# Altium footprint library SILICA_PCBLIB.PcbLib: 161 footprints (part 3 of 11)
Each footprint in its own frame and in the unit in brackets; x right, y up, seen from the top. Pads: shape width x height; smd on the part's side, far side on the other; paste and mask are expansions set on the pad; w line width, h text height; cw(c..) or ccw(c..) is an arc to the next point about the centre after c.
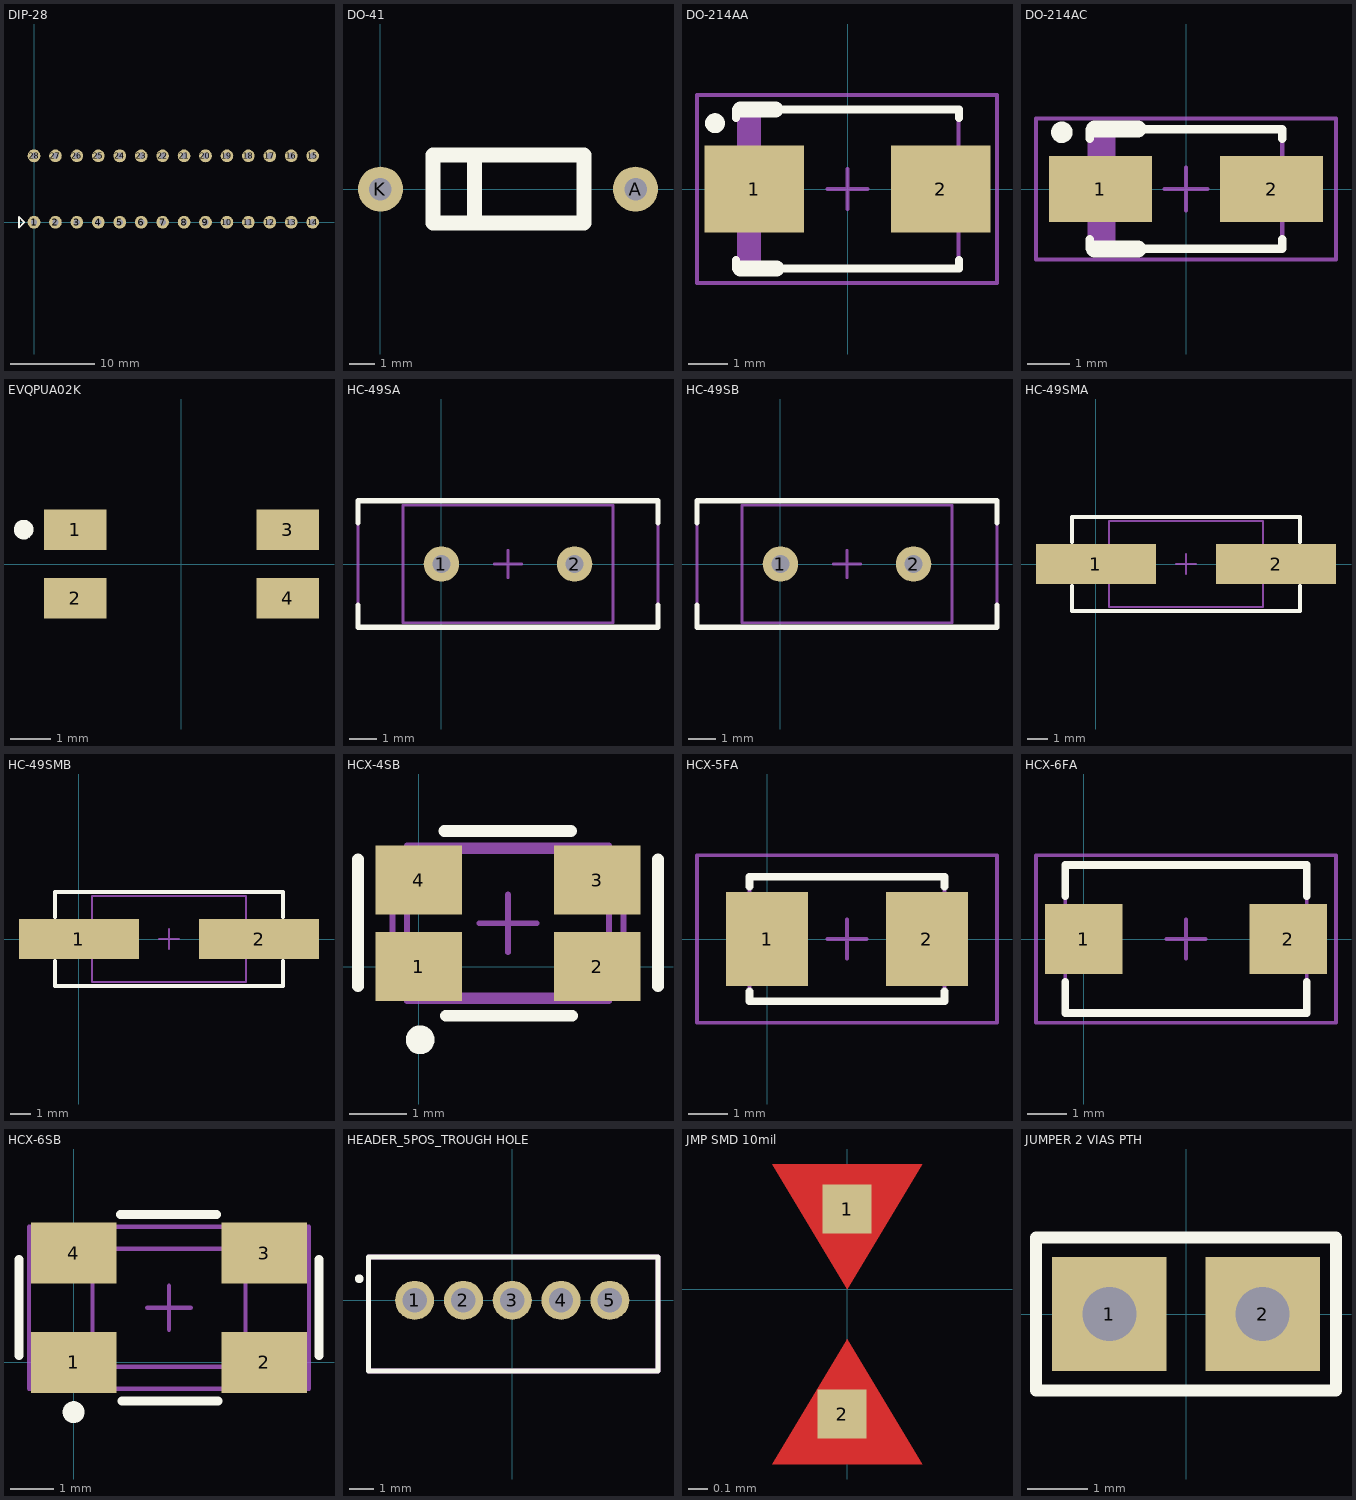
[diagram p2: the footprints below, top view; thin cyan lines are the x and y axes]

## DIP-28 [mm]
pads (28):
  round 1.5 hole 0.75: 1(0,0) 2(2.54,0) 3(5.08,0) 4(7.62,0) 5(10.16,0) 6(12.7,0) 7(15.24,0) 8(17.78,0) 9(20.32,0) 10(22.86,0) 11(25.4,0) 12(27.94,0) 13(30.48,0) 14(33.02,0) 15(33.02,7.87) 16(30.48,7.87) 17(27.94,7.87) 18(25.4,7.87) 19(22.86,7.87) 21(17.78,7.87) 22(15.24,7.87) 23(12.7,7.87) 25(7.62,7.87) 26(5.08,7.87) 27(2.54,7.87)
  round 1.524 hole 0.762: 20(20.32,7.87) 24(10.16,7.87) 28(0,7.87)
Top Overlay:
  lines w0.2: -1.778,-0.635 -1.778,0.635 -1.143,0 -1.778,-0.635
3D body "SW3dPS-28 pin dip.STEP": height 4.65, standoff -1.57, extent -1.651,0 34.29,7.874

## DO-41 [mm] "DO-41"
pads (2):
  round 1.8 hole 0.9: A(10.2,0) K(0,0)
Top Overlay:
  lines w0.6: 3.755,-1.311 3.755,1.363 ; 2.097,-1.358 2.097,-0.761 2.097,1.36 8.147,1.36 8.147,-1.358 2.097,-1.358
3D body "User Library-DO-41-3.STEP": height 3.35, standoff -2, extent -0.382,-1.341 10.638,1.359

## DO-214AA [mm]
height 2.3
pads (2):
  rect 2.5x2.2 smd paste-0.051 mask+0: 1(-2.35,0) 2(2.35,0)
Top Overlay:
  circle w0.25: c-3.332,1.655 r0.125
  lines w0.2: -2.8,-2.005 -2.8,-1.78 ; -2.8,1.78 -2.8,2.005 ; -2.692,-2 2.8,-2 ; -2.667,2 2.8,2 ; 2.8,-2.005 2.8,-1.78 ; 2.8,1.78 2.8,2.005
  lines w0.4: -2.692,-2 -1.784,-2 ; -2.692,2 -1.809,2
Mechanical 13:
  rectangle: -2.783,-2 -2.178,2
  lines w0.1: -2.25,-1.975 -2.25,1.981 2.794,1.981 2.794,-1.975 -2.25,-1.975
Mechanical 15:
  lines w0.1: -0.5,0 0.5,0 ; 0,-0.5 0,0.5 ; -3.785,-2.362 -3.785,2.362 3.759,2.362 3.759,-2.362 -3.785,-2.362
3D body "User Library-DO-214AA(SMB).STEP": height 2.6, standoff -0.05, extent -2.794,-1.975 2.794,1.975

## DO-214AC [mm]
height 2.3
pads (2):
  rect 2.4x1.55 smd paste-0.051 mask+0: 1(-2,0) 2(2,0)
Top Overlay:
  circle w0.25: c-2.9,1.325 r0.125
  lines w0.2: -2.25,-1.175 -2.25,-1.4 2.25,-1.4 2.25,-1.175 ; -2.25,1.175 -2.25,1.4 2.25,1.4 2.25,1.175
  lines w0.4: -2.134,-1.4 -1.118,-1.4 ; -2.134,1.4 -1.118,1.4
Mechanical 13:
  rectangle: -2.25,-1.395 -1.645,1.395
  lines w0.1: -2.25,-1.395 2.25,-1.395 2.25,1.395 -2.25,1.395 -2.25,-1.395
Mechanical 15:
  lines w0.1: -0.5,0 0.5,0 ; 0,-0.5 0,0.5 ; -3.505,-1.65 3.505,-1.65 3.505,1.65 -3.505,1.65 -3.505,-1.65
3D body "SW3dPS-DO-214AC SMA.STEP": height 1, standoff -1.4, extent -2.6,-1.3 2.6,1.3

## EVQPUA02K [mm]
pads (4):
  rect 1.55x1 smd: 1(-2.625,0.85) 2(-2.625,-0.85) 3(2.625,0.85) 4(2.625,-0.85)
Top Overlay:
  circle w0.254: c-3.9,0.85 r0.115
3D body "EVQPU-JA-02K.STEP": height 1.65, standoff 0, extent -3.188,-1.79 3.212,2.75

## HC-49SA [mm] "LOW PROFILE HOLDER TYPE CRYSTAL UNITS"
height 3.5
pads (2):
  round 1.3 hole 0.65: 1(0,0) 2(4.88,0)
Top Overlay:
  lines w0.2: -3.06,-1.52 -3.06,-2.32 7.94,-2.32 7.94,-1.52 ; -3.06,1.52 -3.06,2.32 7.94,2.32 7.94,1.52
Mechanical 13:
  lines w0.1: -3.06,-2.32 7.94,-2.32 7.94,2.32 -3.06,2.32 -3.06,-2.32
Mechanical 15:
  lines w0.1: 1.94,0 2.94,0 ; 2.44,-0.5 2.44,0.5 ; -1.41,-2.15 -1.41,2.15 6.29,2.15 6.29,-2.15 -1.41,-2.15
3D body "SW3dPS-HC49S.STEP": height 3.63, standoff -1.97, extent -3.149,-2.299 8.023,2.373

## HC-49SB [mm] "LOW PROFILE HOLDER TYPE CRYSTAL UNITS"
height 2.5
pads (2):
  round 1.3 hole 0.65: 1(0,0) 2(4.88,0)
Top Overlay:
  lines w0.2: -3.06,-1.52 -3.06,-2.32 7.94,-2.32 7.94,-1.52 ; -3.06,1.52 -3.06,2.32 7.94,2.32 7.94,1.52
Mechanical 13:
  lines w0.1: -3.06,-2.32 -3.06,2.32 7.94,2.32 7.94,-2.32 -3.06,-2.32
Mechanical 15:
  lines w0.1: 1.94,0 2.94,0 ; 2.44,-0.5 2.44,0.5 ; -1.41,-2.15 6.29,-2.15 6.29,2.15 -1.41,2.15 -1.41,-2.15
3D body "SW3dPS-HC49S.STEP": height 3.63, standoff -1.97, extent -3.138,-2.325 8.034,2.348

## HC-49SMA [mm] "SURFACE MOUNT CRYSTAL"
height 4.2
pads (2):
  rect 6x2 smd paste-0.051 mask+0: 1(0,0) 2(9,0)
Top Overlay:
  lines w0.2: -1.2,-1.1 -1.2,-2.35 10.2,-2.35 10.2,-1.1 ; -1.2,1.1 -1.2,2.35 10.2,2.35 10.2,1.1
Mechanical 13:
  lines w0.1: -1.2,-2.35 -1.2,2.35 10.2,2.35 10.2,-2.35 -1.2,-2.35
Mechanical 15:
  lines w0.1: 4,0 5,0 ; 4.5,-0.5 4.5,0.5 ; 0.65,-2.15 8.35,-2.15 8.35,2.15 0.65,2.15 0.65,-2.15
3D body: height 4.2, standoff 0, extent -1.2,-2.35 10.2,2.35

## HC-49SMB [mm] "SURFACE MOUNT CRYSTAL"
height 3.2
pads (2):
  rect 6x2 smd paste-0.051 mask+0: 1(0,0) 2(9,0)
Top Overlay:
  lines w0.2: -1.2,-1.1 -1.2,-2.35 10.2,-2.35 10.2,-1.1 ; -1.2,1.1 -1.2,2.35 10.2,2.35 10.2,1.1
Mechanical 13:
  lines w0.1: -1.2,-2.35 10.2,-2.35 10.2,2.35 -1.2,2.35 -1.2,-2.35
Mechanical 15:
  lines w0.1: 4,0 5,0 ; 4.5,-0.5 4.5,0.5 ; 0.65,-2.15 0.65,2.15 8.35,2.15 8.35,-2.15 0.65,-2.15
3D body: height 3.2, standoff 0, extent -1.2,-2.35 10.2,2.35

## HCX-4SB [mm] "Cristal de Quartzo em SMD"
height 1
pads (4):
  rect 1.5x1.2 smd paste-0.051 mask+0: 1(0,0) 2(3.1,0) 3(3.1,1.5) 4(0,1.5)
Top Overlay:
  circle w0.25: c0.028,-1.269 r0.125
  lines w0.2: -1.05,-0.342 -1.05,1.858 ; 0.442,2.35 2.642,2.35 ; 0.468,-0.85 2.668,-0.85 ; 4.15,-0.342 4.15,1.858
Mechanical 13:
  lines w0.1: -0.45,-0.5 -0.45,2 3.55,2 3.55,-0.5 -0.45,-0.5
Mechanical 15:
  lines w0.1: 1.05,0.75 2.05,0.75 ; 1.55,0.25 1.55,1.25 ; -0.2,-0.6 -0.2,2.1 3.3,2.1 3.3,-0.6 -0.2,-0.6
3D body: height 1.2, standoff 0, extent -0.45,-0.5 3.55,2

## HCX-5FA [mm] "SURFACE MOUNT CRYSTAL"
height 1.2
pads (2):
  rect 2.1x2.4 smd paste-0.051 mask+0: 1(0,0) 2(4.1,0)
Top Overlay:
  lines w0.2: -0.45,-1.35 -0.45,-1.6 4.55,-1.6 4.55,-1.35 ; -0.45,1.35 -0.45,1.6 4.55,1.6 4.55,1.35
Mechanical 13:
  lines w0.1: -0.45,-1.6 -0.45,1.6 4.55,1.6 4.55,-1.6 -0.45,-1.6
Mechanical 15:
  lines w0.1: 1.55,0 2.55,0 ; 2.05,-0.5 2.05,0.5 ; -1.8,-2.15 5.9,-2.15 5.9,2.15 -1.8,2.15 -1.8,-2.15
3D body: height 1.2, standoff 0, extent -0.45,-1.6 4.55,1.6

## HCX-6FA [mm] "SURFACE MOUNT CRYSTAL"
height 1.2
pads (2):
  rect 2x1.8 smd paste-0.051 mask+0: 1(0,0) 2(5.25,0)
Top Overlay:
  lines w0.2: -0.475,-1.1 -0.475,-1.9 5.725,-1.9 5.725,-1.1 ; -0.475,1.1 -0.475,1.9 5.725,1.9 5.725,1.1
Mechanical 13:
  lines w0.1: -0.475,-1.85 -0.475,1.85 5.725,1.85 5.725,-1.85 -0.475,-1.85
Mechanical 15:
  lines w0.1: 2.125,0 3.125,0 ; 2.625,-0.5 2.625,0.5 ; -1.225,-2.15 -1.225,2.15 6.475,2.15 6.475,-2.15 -1.225,-2.15
3D body: height 1.2, standoff 0, extent -0.475,-1.85 5.725,1.85

## HCX-6SB [mm] "Cristal de Quartzo em SMD"
height 1
pads (4):
  rect 1.95x1.4 smd paste-0.051 mask+0: 1(0,0) 2(4.35,0) 3(4.35,2.5) 4(0,2.5)
Top Overlay:
  circle w0.25: c-0.007,-1.138 r0.125
  lines w0.2: -1.254,0.158 -1.254,2.358 ; 1.067,3.384 3.267,3.384 ; 1.093,-0.884 3.293,-0.884 ; 5.604,0.158 5.604,2.358
Mechanical 13:
  lines w0.1: -1.025,-0.6 -1.025,3.1 5.375,3.1 5.375,-0.6 -1.025,-0.6
Mechanical 15:
  lines w0.1: 1.675,1.25 2.675,1.25 ; 2.175,0.75 2.175,1.75 ; 0.425,-0.1 0.425,2.6 3.925,2.6 3.925,-0.1 0.425,-0.1
3D body: height 1, standoff 0, extent -1.025,-0.6 5.375,3.1

## HEADER_5POS_TROUGH HOLE [mm]
pads (5):
  round 1.6 hole 1: 1(-4,0) 2(-2,0) 3(0,0) 4(2,0) 5(4,0)
Top Overlay:
  lines w0.203: -5.9,-2.9 -5.9,1.775 5.975,1.775 5.975,-2.9 -5.9,-2.9
  lines w0.254: -6.223,0.889 ccw(c-6.272,0.881) -6.222,0.881
Mechanical 13:
  lines w0.203: -5.9,-2.9 5.975,-2.9 5.975,1.775 -5.9,1.775 -5.9,-2.9
3D body "6165.stp": height 6.53, standoff -2.93, extent -5.95,-2.925 6.05,1.725

## JMP SMD 10mil [mm]
pads (2):
  rect 0.25x0.25 smd paste+0 mask+0: 1(0,0.406) 2(-0.025,-0.635)
Top Layer:
  region: 0,0 0.381,0.635 -0.381,0.635
  region: 0,-0.254 -0.381,-0.889 0.381,-0.889

## JUMPER 2 VIAS PTH [mm]
height 1.3
pads (2):
  rect 1.9x1.9 hole 0.9: 1(-1.27,0) 2(1.27,0)
Top Overlay:
  lines w0.2: -2.489,-1.27 -2.489,1.27 0,1.27 2.489,1.27 2.489,-1.27 0,-1.27 -2.489,-1.27